# Altium footprint library PcbLib1.PcbLib: 37 footprints (part 2 of 3)
Each footprint in its own frame and in the unit in brackets; x right, y up, seen from the top. Pads: shape width x height; smd on the part's side, far side on the other; paste and mask are expansions set on the pad; w line width, h text height; cw(c..) or ccw(c..) is an arc to the next point about the centre after c.
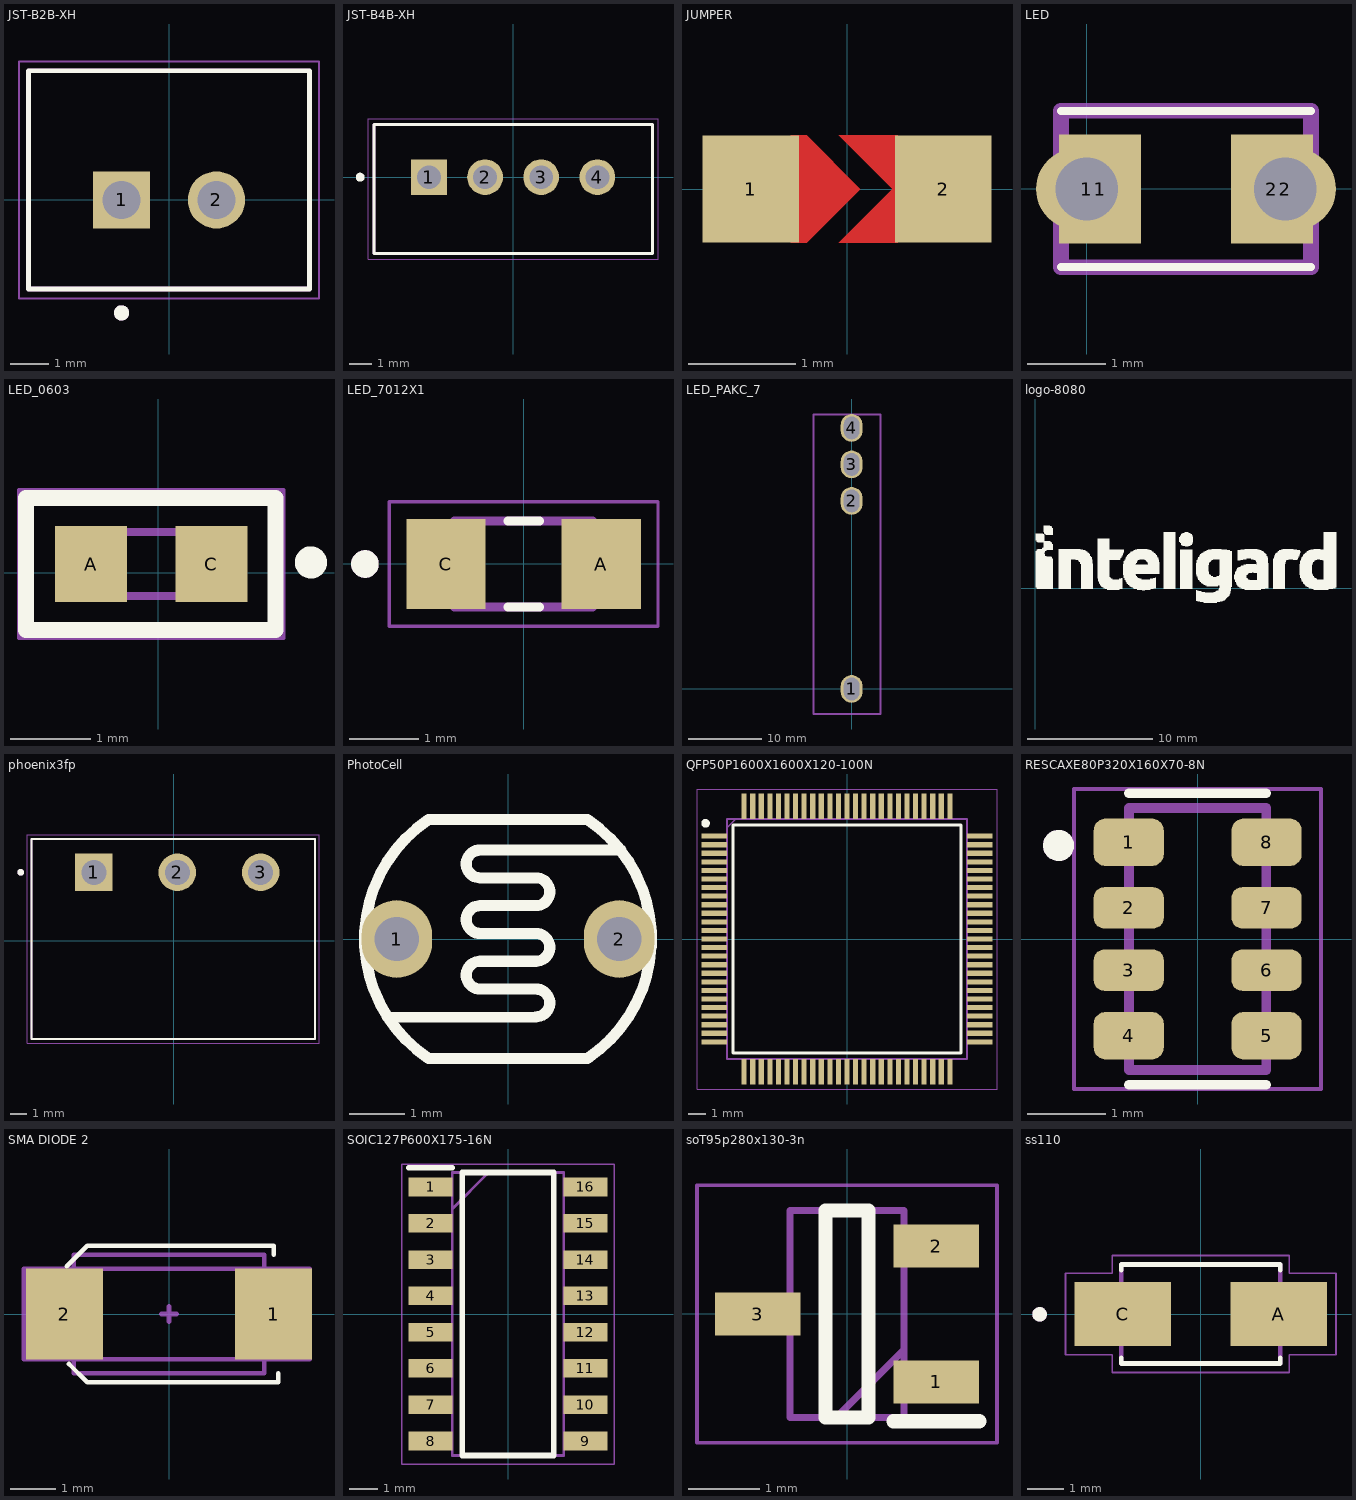
[diagram p1: the footprints below, top view; thin cyan lines are the x and y axes]

## JST-B2B-XH [mm]
pads (2):
  rect 1.508x1.508 hole 1: 1(-1.25,0)
  round 1.508 hole 1: 2(1.25,0)
Top Overlay:
  circle w0.2: c-1.25,-2.975 r0.1
  lines w0.127: -3.7,-2.35 -3.7,3.4 3.7,3.4 3.7,-2.35 -3.7,-2.35
Mechanical 13:
  circle w0.2: c-1.25,-2.975 r0.1
  lines w0.127: -3.7,-2.35 -3.7,3.4 3.7,3.4 3.7,-2.35 -3.7,-2.35
Mechanical 15:
  lines w0.05: -3.95,-2.6 -3.95,3.65 3.95,3.65 3.95,-2.6 -3.95,-2.6
3D body "B2B-XH-A(LF)(SN)--3DModel-STEP-56544.STEP": height 7, standoff -3.4, extent -3.7,-2.333 3.7,3.417

## JST-B4B-XH [mm]
pads (4):
  rect 1.59x1.59 hole 1.06: 1(-3.75,0)
  round 1.59 hole 1.06: 2(-1.25,0) 3(1.25,0) 4(3.75,0)
Top Overlay:
  circle w0.2: c-6.81,0 r0.1
  lines w0.127: -6.2,-3.4 -6.2,2.35 6.2,2.35 6.2,-3.4 -6.2,-3.4
Mechanical 13:
  lines w0.127: -6.2,-3.4 -6.2,2.35 6.2,2.35 6.2,-3.4 -6.2,-3.4
Mechanical 15:
  lines w0.05: -6.45,-3.65 -6.45,2.6 6.45,2.6 6.45,-3.65 -6.45,-3.65
3D body "step_temp.STEP": height 7, standoff -3.4, extent -6.2,-3.4 6.2,2.35

## JUMPER [mm]
pads (2):
  rect 0.9x1 smd mask+0.05: 1(-0.9,0) 2(0.9,0)
Top Layer:
  region: -0.375,0.5 0.125,0 -0.375,-0.5 -0.525,-0.5 -0.525,0.5
  region: 0.475,0.5 -0.075,0.5 0.475,-0.05
  region: 0.475,0.05 0.475,-0.5 -0.075,-0.5

## LED [mm]
height 0.9
pads (4):
  oval 1.3x1.05 hole 0.8: 1(0,0) 2(2.54,0)
  rect 1.05x1.4 smd: 1(0.17,0) 2(2.37,0)
Top Overlay:
  lines w0.1: -0.33,-1 2.87,-1 ; -0.33,1 2.87,1
Mechanical 13:
  lines w0.2: -0.33,-1 2.87,-1 2.87,1 -0.33,1 -0.33,-1
3D body "OSRBP27BA1B.stp": height 4.25, standoff -5, extent -0.33,-1 2.87,1

## LED_0603 [mm]
pads (2):
  rect 0.9x0.95 smd: A(-0.838,0.107) C(0.662,0.107)
Top Overlay:
  circle w0.2: c1.905,0.127 r0.1
  lines w0.2: -0.838,-0.718 1.462,-0.718 ; 1.462,-0.718 -1.651,-0.718 -1.651,0.932 -0.838,0.932 1.462,0.932 1.462,-0.718
Mechanical 13:
  lines w0.1: 0.445,-0.293 0.712,-0.026 ; -0.888,-0.293 -0.888,0.507 0.712,0.507 0.712,-0.293 -0.888,-0.293
Mechanical 15:
  lines w0.05: -1.738,-0.818 -1.738,1.032 1.562,1.032 1.562,-0.818 -1.738,-0.818
3D body "150060GS55040.stp": height 0.4, standoff 0, extent -0.888,-0.293 0.712,0.507

## LED_7012X1 [mm]
pads (2):
  rect 1.15x1.3 smd: A(1.125,0) C(-1.125,0)
Top Overlay:
  circle w0.2: c-2.3,0 r0.1
  lines w0.127: -0.23,-0.625 0.23,-0.625 ; -0.23,0.625 0.23,0.625
Mechanical 13:
  circle w0.2: c-2.3,0 r0.1
  lines w0.127: -1,-0.625 1,-0.625 1,0.625 -1,0.625 -1,-0.625
Mechanical 15:
  lines w0.05: -1.95,-0.9 1.95,-0.9 1.95,0.9 -1.95,0.9 -1.95,-0.9
3D body "7012X1--3DModel-STEP-1.STEP": height 0.73, standoff 0, extent -1.003,-0.622 1.003,0.622

## LED_PAKC_7 [mm]
pads (4):
  oval 3x3.8 hole 2.1 slot 3.1 at 90 deg: 1(0,0) 2(0,25.75) 3(0,30.75) 4(0,35.75)
Top Courtyard:
  lines w0.3: -5.207,-3.429 -5.207,37.592 3.937,37.592 3.937,-3.429 -5.207,-3.429
3D body "LED BOARD16.step": height 2.8, standoff -3.2, extent -5.175,-3.514 4.075,37.495

## logo-8080 [mm]
Top Overlay:
  drawing of 1858 lines, arcs and shapes, not listed

## phoenix3fp [mm]
pads (3):
  rect 2.25x2.25 hole 1.5: 1(-4.781,4.097)
  round 2.25 hole 1.5: 2(0.219,4.097) 3(5.219,4.097)
Top Overlay:
  circle w0.2: c-9.181,4.097 r0.1
  lines w0.127: -8.531,-5.903 8.469,-5.903 8.469,6.097 -8.531,6.097 -8.531,-5.903
Mechanical 13:
  circle w0.2: c-9.181,4.097 r0.1
  lines w0.127: -8.531,-5.903 -8.531,6.097 8.469,6.097 8.469,-5.903 -8.531,-5.903
Mechanical 15:
  lines w0.05: -8.781,-6.153 8.719,-6.153 8.719,6.347 -8.781,6.347 -8.781,-6.153
3D body "2EDGR-5.08-03P-14-00AH.STEP": height 8.2, standoff -4, extent -7.651,-5.953 7.589,6.147
3D body "2EDGK-5.08-03P-14-00AH.STEP": height 15.1, standoff 0, extent -7.651,-24.795 7.589,-7.395

## PhotoCell [mm]
pads (2):
  oval 1.27x1.397 hole 0.8: 1(-2,0) 2(2,0)
Top Overlay:
  lines w0.2: -2.16,-1.41 0.5,-1.4 ccw(c0.502,-1.15) 0.501,-0.9 -0.5,-0.9 cw(c-0.502,-0.65) -0.5,-0.4 0.5,-0.4 ccw(c0.502,-0.15) 0.501,0.1 -0.5,0.1 cw(c-0.502,0.35) -0.5,0.6 0.5,0.6 ccw(c0.502,0.85) 0.501,1.1 -0.499,1.1 ; -1.43,-2.15 1.429,-2.15 ; -1.43,2.15 1.429,2.148 cw(c0,0) 1.428,-2.149 ; -1.429,-2.148 cw(c0,0) -1.429,2.148 ; -0.5,1.1 cw(c-0.501,1.35) -0.499,1.6 2.03,1.6
3D body "LDR.STEP": height 2.44, standoff -2.3, extent -2.605,-2.159 2.605,2.141

## QFP50P1600X1600X120-100N [mm]
pads (100):
  rect 1.5x0.3 smd: 1(-7.75,6) 2(-7.75,5.5) 3(-7.75,5) 4(-7.75,4.5) 5(-7.75,4) 6(-7.75,3.5) 7(-7.75,3) 8(-7.75,2.5) 9(-7.75,2) 10(-7.75,1.5) 11(-7.75,1) 12(-7.75,0.5) 13(-7.75,0) 14(-7.75,-0.5) 15(-7.75,-1) 16(-7.75,-1.5) 17(-7.75,-2) 18(-7.75,-2.5) 19(-7.75,-3) 20(-7.75,-3.5) 21(-7.75,-4) 22(-7.75,-4.5) 23(-7.75,-5) 24(-7.75,-5.5) 25(-7.75,-6) 51(7.75,-6) 52(7.75,-5.5) 53(7.75,-5) 54(7.75,-4.5) 55(7.75,-4) 56(7.75,-3.5) 57(7.75,-3) 58(7.75,-2.5) 59(7.75,-2) 60(7.75,-1.5) 61(7.75,-1) 62(7.75,-0.5) 63(7.75,0) 64(7.75,0.5) 65(7.75,1) 66(7.75,1.5) 67(7.75,2) 68(7.75,2.5) 69(7.75,3) 70(7.75,3.5) 71(7.75,4) 72(7.75,4.5) 73(7.75,5) 74(7.75,5.5) 75(7.75,6)
  rect 0.3x1.5 smd: 26(-6,-7.75) 27(-5.5,-7.75) 28(-5,-7.75) 29(-4.5,-7.75) 30(-4,-7.75) 31(-3.5,-7.75) 32(-3,-7.75) 33(-2.5,-7.75) 34(-2,-7.75) 35(-1.5,-7.75) 36(-1,-7.75) 37(-0.5,-7.75) 38(0,-7.75) 39(0.5,-7.75) 40(1,-7.75) 41(1.5,-7.75) 42(2,-7.75) 43(2.5,-7.75) 44(3,-7.75) 45(3.5,-7.75) 46(4,-7.75) 47(4.5,-7.75) 48(5,-7.75) 49(5.5,-7.75) 50(6,-7.75) 76(6,7.75) 77(5.5,7.75) 78(5,7.75) 79(4.5,7.75) 80(4,7.75) 81(3.5,7.75) 82(3,7.75) 83(2.5,7.75) 84(2,7.75) 85(1.5,7.75) 86(1,7.75) 87(0.5,7.75) 88(0,7.75) 89(-0.5,7.75) 90(-1,7.75) 91(-1.5,7.75) 92(-2,7.75) 93(-2.5,7.75) 94(-3,7.75) 95(-3.5,7.75) 96(-4,7.75) 97(-4.5,7.75) 98(-5,7.75) 99(-5.5,7.75) 100(-6,7.75)
Top Overlay:
  circle w0.25: c-8.25,6.75 r0.125
  lines w0.2: -6.65,-6.65 -6.65,6.65 6.65,6.65 6.65,-6.65 -6.65,-6.65
Mechanical 13:
  lines w0.1: -7,6.5 -6.5,7 ; -7,-7 -7,7 7,7 7,-7 -7,-7
Mechanical 15:
  lines w0.05: -8.75,-8.75 -8.75,8.75 8.75,8.75 8.75,-8.75 -8.75,-8.75
3D body "ATMEGA2560-16AUR.stp": height 1.2, standoff 0, extent -8,-8 8,8

## RESCAXE80P320X160X70-8N [mm]
pads (8):
  rrect50% 0.9x0.61 smd: 1(-0.885,1.24) 4(-0.885,-1.24) 5(0.885,-1.24) 8(0.885,1.24)
  rrect50% 0.9x0.53 smd: 2(-0.885,0.4) 3(-0.885,-0.4) 6(0.885,-0.4) 7(0.885,0.4)
Top Overlay:
  circle w0.2: c-1.785,1.2 r0.1
  lines w0.127: -0.88,-1.87 0.88,-1.87 ; -0.88,1.87 0.88,1.87 -0.88,1.87
Mechanical 13:
  circle w0.2: c-1.785,1.2 r0.1
  lines w0.127: -0.88,1.68 0.88,1.68 ; -0.88,1.68 -0.88,-1.68 0.88,-1.68 0.88,1.68 ; -0.88,1.68 0.88,1.68
Mechanical 15:
  lines w0.05: -1.585,-1.925 -1.585,1.925 1.585,1.925 1.585,-1.925 -1.585,-1.925

## SMA DIODE 2 [mm]
pads (2):
  rect 1.7x2 smd: 1(2.3,0) 2(-2.3,0)
Top Overlay:
  lines w0.1: -2.25,1.05 -1.8,1.5 2.3,1.5 2.3,1.3 ; -2.2,-1.1 -1.8,-1.5 2.4,-1.5 2.4,-1.3
Mechanical 13:
  lines w0.1: -2.1,-1.3 -2.1,1.3 2.1,1.3 2.1,-1.3 -2.1,-1.3
Mechanical 15:
  lines w0.1: -0.175,0 0.175,0 ; 0,-0.175 0,0.175 ; -3.2,-1 -3.2,1 3.1,1 3.1,-1 -3.2,-1
3D body: height 0.55, standoff 0, extent -2.1,-1.3 2.1,1.3

## SOIC127P600X175-16N [mm]
pads (16):
  rect 1.525x0.65 smd: 1(-2.712,4.445) 2(-2.712,3.175) 3(-2.712,1.905) 4(-2.712,0.635) 5(-2.712,-0.635) 6(-2.712,-1.905) 7(-2.712,-3.175) 8(-2.712,-4.445) 9(2.712,-4.445) 10(2.712,-3.175) 11(2.712,-1.905) 12(2.712,-0.635) 13(2.712,0.635) 14(2.712,1.905) 15(2.712,3.175) 16(2.712,4.445)
Top Overlay:
  lines w0.2: -3.475,5.12 -1.95,5.12 ; -1.6,-4.95 1.6,-4.95 1.6,4.95 -1.6,4.95 -1.6,-4.95
Mechanical 13:
  lines w0.1: -1.95,3.68 -0.68,4.95 ; -1.95,-4.95 1.95,-4.95 1.95,4.95 -1.95,4.95 -1.95,-4.95
Mechanical 15:
  lines w0.05: -3.725,-5.25 3.725,-5.25 3.725,5.25 -3.725,5.25 -3.725,-5.25
3D body "MAX3232ECD.stp": height 1.75, standoff 0, extent -3.013,-4.94 3.013,4.96

## soT95p280x130-3n [mm]
pads (3):
  rect 1.2x0.6 smd: 1(1.25,-0.95) 2(1.25,0.95) 3(-1.25,0)
Top Overlay:
  lines w0.2: 0.65,-1.5 1.85,-1.5 ; -0.3,-1.45 0.3,-1.45 0.3,1.45 -0.3,1.45 -0.3,-1.45
Mechanical 13:
  lines w0.1: -0.15,-1.45 0.8,-0.5 ; -0.8,-1.45 -0.8,1.45 0.8,1.45 0.8,-1.45 -0.8,-1.45
Mechanical 15:
  lines w0.05: -2.1,-1.8 -2.1,1.8 2.1,1.8 2.1,-1.8 -2.1,-1.8
3D body "TS78L05CX_RFG.stp": height 1.3, standoff 0, extent -1.4,-1.503 1.4,1.397

## ss110 [mm]
pads (2):
  rect 2.65x1.75 smd: A(2.15,0) C(-2.15,0)
Top Overlay:
  circle w0.2: c-4.44,-0.01 r0.1
  lines w0.127: -2.187,-1.2 -2.187,-1.362 2.188,-1.362 2.188,-1.2 ; -2.187,1.2 -2.187,1.362 2.188,1.362 2.188,1.2
Mechanical 13:
  circle w0.2: c-4.44,-0.01 r0.1
  lines w0.127: -2.187,-1.362 2.188,-1.362 2.188,1.362 -2.187,1.362 -2.187,-1.362
Mechanical 15:
  lines w0.05: -3.725,-1.125 -2.438,-1.125 -2.438,-1.613 2.438,-1.613 2.438,-1.125 3.725,-1.125 3.725,1.125 2.438,1.125 2.438,1.613 -2.438,1.613 -2.438,1.125 -3.725,1.125 -3.725,-1.125
3D body "Diode SS14.SLDPRT": height 2.25, standoff 0, extent -2.5,-1.362 2.5,1.338